# Altium footprint library PCBKU.PcbLib: 197 footprints (part 13 of 13)
Each footprint in its own frame and in the unit in brackets; x right, y up, seen from the top. Pads: shape width x height; smd on the part's side, far side on the other; paste and mask are expansions set on the pad; w line width, h text height; cw(c..) or ccw(c..) is an arc to the next point about the centre after c.
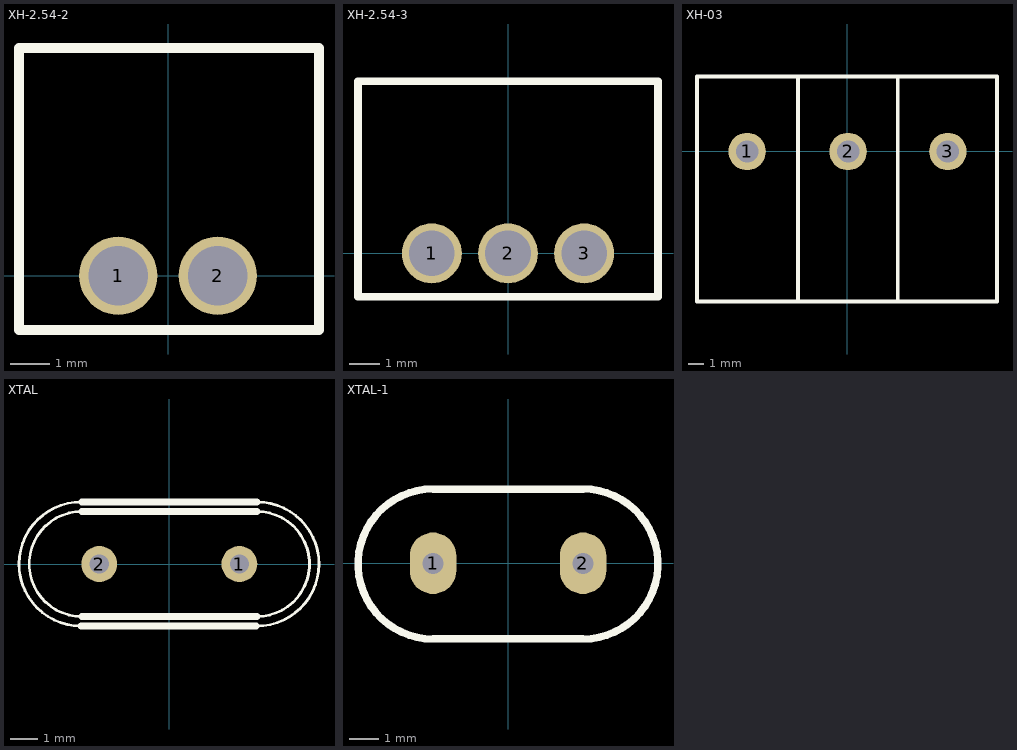
[diagram p12: the footprints below, top view; thin cyan lines are the x and y axes]

## XH-2.54-2 [mm]
pads (2):
  round 2 hole 1.524: 1(-1.27,0) 2(1.27,0)
Top Overlay:
  lines w0.254: -3.81,-1.383 3.86,-1.383 3.86,5.817 -3.81,5.817 -3.81,-1.383

## XH-2.54-3 [mm]
pads (3):
  round 2 hole 1.524: 1(-2.54,0) 2(0,0) 3(2.54,0)
Top Overlay:
  lines w0.254: -5,-1.448 5,-1.448 5,5.74 -5,5.74 -5,-1.448

## XH-03 [mm]
pads (3):
  round 2.5 hole 1.5: 1(-6.693,0) 2(0.038,0) 3(6.693,0)
Top Overlay:
  lines w0.254: -3.302,-10 -3.302,5 ; 3.353,-10 3.353,5 ; -10.033,-10 9.967,-10 9.967,5 -10.033,5 -10.033,-10

## XTAL [mm]
pads (2):
  round 1.3 hole 0.7: 1(2.54,0) 2(-2.54,0)
Top Overlay:
  lines w0.1: -3.2,-2.25 cw(c-3.2,0) -3.177,2.25 ; -3.175,-1.905 cw(c-3.175,0) -3.175,1.905 ; 3.151,-2.25 ccw(c3.175,0) 3.175,2.25 ; 3.175,-1.905 ccw(c3.175,0) 3.175,1.905
  lines w0.25: -3.2,-2.25 3.151,-2.25 ; -3.177,2.25 3.175,2.25 ; -3.175,-1.905 3.175,-1.905 ; -3.175,1.905 3.175,1.905

## XTAL-1 [mil]
pads (2):
  oval 62x82 hole 28: 1(-100,0) 2(100,0)
Top Overlay:
  lines w10: -100,-101 cw(c-100,-1) -100,99 100,99 cw(c100,-1) 100,-101 -100,-101